# Altium integrated library caravan_pcb.IntLib: 36 symbols
Pins are listed as number, name and electrical type; pins without a type are passive.

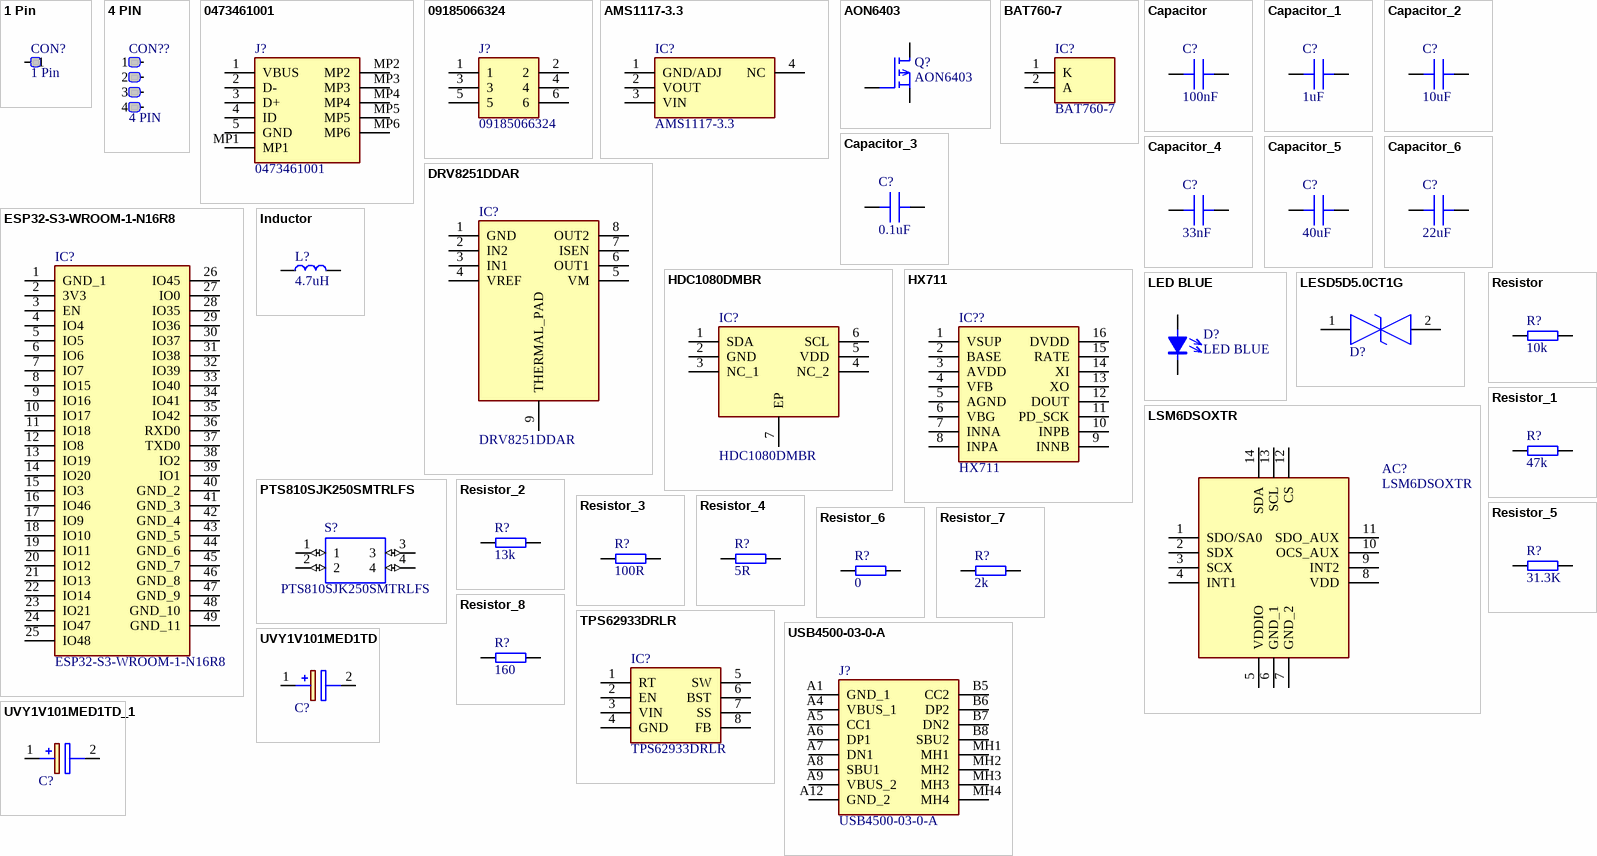
[diagram p0: symbols 1 Pin to UVY1V101MED1TD_1]

## 1 Pin
designator CON?
footprint SMD PAD
footprint SMD PAD 2.54x5.08
footprint GOLDPIN 2.54mm 1P
footprint PAD 1mm
pins: 1

## 4 PIN
designator CON??
footprint SM04B-SRSS-TB
footprint Goldpin 1.27mm 4PIN
footprint BM04B-SRSS-TB
footprint Goldpin 2.54 4P
footprint 4 Pads raster 2.54mm
footprint S/BM04B-SRSS-TB (JST SH 1.00mm 4Pin Side/Top)
pins: 1, 2, 3, 4

## 0473461001
designator J?
Connector; Manufacturer_Name: Molex; Datasheet Link: https://componentsearchengine.com/Datasheets/1/0473461001.pdf; Height: 2.45mm; Manufacturer_Part_Number: 0473461001; Mouser Part Number: N/A; Mouser Price/Stock: https://www.mouser.co.uk/ProductDetail/Molex/0473461001?qs=2bnkQPT%252BPafTZgGVt%2FOGfA%3D%3D; Arrow Part Number: 0473461001; Arrow Price/Stock: https://www.arrow.com/en/products/0473461001/molex?region=nac
footprint 0473461001
pins: 1 VBUS, 2 D-, 3 D+, 4 ID, 5 GND, MP1, MP2, MP3, MP4, MP5, MP6

## 09185066324
designator J?
Connector; Manufacturer_Name: HARTING; Datasheet Link: https://b2b.harting.com/files/download/PRD/PDF_DS/PDF_DS_09185066324_EN.pdf; Manufacturer_Part_Number: 09185066324; Mouser Part Number: 617-09185066324; Mouser Price/Stock: https://www.mouser.co.uk/ProductDetail/HARTING/09185066324?qs=qa49y27LPCE%2F3ZplMsKEeQ%3D%3D; Arrow Part Number: 09185066324; Arrow Price/Stock: https://www.arrow.com/en/products/09185066324/harting?utm_currency=USD&region=europe
footprint 09185066324
pins: 1, 2, 3, 4, 5, 6

## AMS1117-3.3
designator IC?
Integrated Circuit; Manufacturer_Name: Advanced; Datasheet Link: https://datasheet.datasheetarchive.com/originals/distributors/Datasheets-28/DSA-550594.pdf; Height: 1.8mm; Manufacturer_Part_Number: AMS1117-3.3
footprint SOT229P700X180-4N
pins: 1 GND/ADJ, 2 VOUT, 3 VIN, 4 NC

## AON6403
designator Q?
P-Mosfet 30V 67A Rds(on) 3.1mR
footprint DFN 5x6 (PowerMOSFET)
pins: 1, 2, 3 S, 4 G, 5_8 D

## BAT760-7
designator IC?
Integrated Circuit; Manufacturer_Name: Lattice Semiconductor; Datasheet Link: https://www.diodes.com/assets/Datasheets/ds30498.pdf; Height: 1.2mm; Manufacturer_Part_Number: BAT760-7; Mouser Part Number: N/A; Mouser Price/Stock: https://www.mouser.com/Search/Refine.aspx?Keyword=N%2FA
footprint SOD2513X120N
pins: 1 K, 2 A

## Capacitor
designator C?, comment 100nF
MLCC Capacitor
footprint C 0402 (0402 resistor Chip)
footprint C 0603
footprint C 0805
footprint C 1206
pins: 1, 2

## Capacitor_1
designator C?, comment 1uF
MLCC Capacitor
footprint C 0402 (0402 resistor Chip)
footprint C 0603
footprint C 0805
footprint C 1206
pins: 1, 2

## Capacitor_2
designator C?, comment 10uF
MLCC Capacitor
footprint C 0402 (0402 resistor Chip)
footprint C 0603
footprint C 0805
footprint C 1206
pins: 1, 2

## Capacitor_3
designator C?, comment 0.1uF
MLCC Capacitor
footprint C 0402 (0402 resistor Chip)
footprint C 0603
footprint C 0805
footprint C 1206
pins: 1, 2

## Capacitor_4
designator C?, comment 33nF
MLCC Capacitor
footprint C 0402 (0402 resistor Chip)
footprint C 0603
footprint C 0805
footprint C 1206
pins: 1, 2

## Capacitor_5
designator C?, comment 40uF
MLCC Capacitor
footprint C 0402 (0402 resistor Chip)
footprint C 0603
footprint C 0805
footprint C 1206
pins: 1, 2

## Capacitor_6
designator C?, comment 22uF
MLCC Capacitor
footprint C 0402 (0402 resistor Chip)
footprint C 0603
footprint C 0805
footprint C 1206
pins: 1, 2

## DRV8251DDAR
designator IC?
Integrated Circuit; Manufacturer_Name: Texas Instruments; Datasheet Link: https://www.arrow.com/en/products/drv8251ddar/texas-instruments?region=nac; Height: 1.7mm; Manufacturer_Part_Number: DRV8251DDAR; Mouser Part Number: 595-DRV8251DDAR; Mouser Price/Stock: https://www.mouser.co.uk/ProductDetail/Texas-Instruments/DRV8251DDAR?qs=doiCPypUmgHTzZyfapGahQ%3D%3D; Arrow Part Number: DRV8251DDAR; Arrow Price/Stock: https://www.arrow.com/en/products/drv8251ddar/texas-instruments?region=nac
footprint SOIC127P600X170-9N
pins: 1 GND, 2 IN2, 3 IN1, 4 VREF, 5 VM, 6 OUT1, 7 ISEN, 8 OUT2, 9 THERMAL_PAD

## ESP32-S3-WROOM-1-N16R8
designator IC?
Integrated Circuit; Manufacturer_Name: Espressif Systems; Datasheet Link: https://www.espressif.com/sites/default/files/documentation/esp32-s3-wroom-1_wroom-1u_datasheet_en.pdf; Height: 3.25mm; Manufacturer_Part_Number: ESP32-S3-WROOM-1-N16R8; Mouser Part Number: 356-ESP32S3WRM1N16R8; Mouser Price/Stock: https://www.mouser.co.uk/ProductDetail/Espressif-Systems/ESP32-S3-WROOM-1-N16R8?qs=Li%252BoUPsLEnvQc9gW6AMhZg%3D%3D
footprint ESP32S3WROOM1N16R8
pins: 1 GND_1, 2 3V3, 3 EN, 4 IO4, 5 IO5, 6 IO6, 7 IO7, 8 IO15, 9 IO16, 10 IO17, 11 IO18, 12 IO8, 13 IO19, 14 IO20, 15 IO3, 16 IO46, 17 IO9, 18 IO10, 19 IO11, 20 IO12, 21 IO13, 22 IO14, 23 IO21, 24 IO47, 25 IO48, 26 IO45, 27 IO0, 28 IO35, 29 IO36, 30 IO37, 31 IO38, 32 IO39, 33 IO40, 34 IO41, 35 IO42, 36 RXD0, 37 TXD0, 38 IO2, 39 IO1, 40 GND_2, 41 GND_3, 42 GND_4, 43 GND_5, 44 GND_6, 45 GND_7, 46 GND_8, 47 GND_9, 48 GND_10, 49 GND_11

## HDC1080DMBR
designator IC?
Integrated Circuit; Manufacturer_Name: Texas Instruments; Datasheet Link: http://www.ti.com/lit/gpn/HDC1080; Height: 0.8mm; Manufacturer_Part_Number: HDC1080DMBR; Mouser Part Number: 595-HDC1080DMBR; Mouser Price/Stock: https://www.mouser.co.uk/ProductDetail/Texas-Instruments/HDC1080DMBR?qs=8%2FmU9qzJpL9OuhPLRSO9Vg%3D%3D; Arrow Part Number: HDC1080DMBR; Arrow Price/Stock: https://www.arrow.com/en/products/hdc1080dmbr/texas-instruments?region=nac
footprint SON100P300X300X80-7N-D
pins: 1 SDA, 2 GND, 3 NC_1, 4 NC_2, 5 VDD, 6 SCL, 7 EP

## HX711
designator IC??
Integrated Circuit; Manufacturer_Name: AVIA; Datasheet Link: https://cdn.sparkfun.com/datasheets/Sensors/ForceFlex/hx711_english.pdf; Height: 1.6mm; Manufacturer_Part_Number: HX711
footprint SOIC127P600X160-16N
pins: 1 VSUP, 2 BASE, 3 AVDD, 4 VFB, 5 AGND, 6 VBG, 7 INNA, 8 INPA, 9 INNB, 10 INPB, 11 PD_SCK, 12 DOUT, 13 XO, 14 XI, 15 RATE, 16 DVDD

## Inductor
designator L?, comment 4.7uH
General pourpouse inductor
footprint L 0603
footprint L 0805
footprint L 1206
footprint DJNR60454R5FERROCORE
footprint HPI0630 (Power Inductor)
pins: 1, 2

## LED BLUE
designator D?
footprint LED 0603 BLUE
pins: 1, 2

## LESD5D5.0CT1G
designator D?  (value not drawn)
TVS Diode (Bi-directional); Manufacturer_Name: LRC; Height: 0.7mm; Manufacturer_Part_Number: LESD5D5.0CT1G
footprint LESD5D50CT1G
pins: 1, 2

## LSM6DSOXTR
designator AC?
Accelerometer; Manufacturer_Name: STMicroelectronics; Datasheet Link: https://www.st.com/resource/en/datasheet/lsm6dsox.pdf; Manufacturer_Part_Number: LSM6DSOXTR; Mouser Part Number: 511-LSM6DSOXTR; Mouser Price/Stock: https://www.mouser.co.uk/ProductDetail/STMicroelectronics/LSM6DSOXTR?qs=l7cgNqFNU1i9dcjzItLpVQ%3D%3D; Arrow Part Number: LSM6DSOXTR; Arrow Price/Stock: https://www.arrow.com/en/products/lsm6dsoxtr/stmicroelectronics?region=europe
footprint LGA-14_1
pins: 1 SDO/SA0, 2 SDX, 3 SCX, 4 INT1, 5 VDDIO, 6 GND_1, 7 GND_2, 8 VDD, 9 INT2, 10 OCS_AUX, 11 SDO_AUX, 12 CS, 13 SCL, 14 SDA

## PTS810SJK250SMTRLFS
designator S?
Tactile Switch SPST-NO Top Actuated Surface Mount; MF: C&K; SnapEDA_Link: https://www.snapeda.com/parts/PTS810SJK250SMTRLFS/C%26K/view-part/274682/?ref=snap; Package: None; Price: None; MP: PTS810SJK250SMTRLFS; Availability: Unavailable; Value: *
footprint PTS810SJG250SMTRLFS
pins: 1 (io), 2 (io), 3 (io), 4 (io)

## Resistor
designator R?, comment 10k
General pourpouse resistor
footprint R 0402 (0402 resistor Chip)
footprint R 0603
footprint R 0805
footprint R 1206
footprint R 2512
pins: 1, 2

## Resistor_1
designator R?, comment 47k
General pourpouse resistor
footprint R 0402 (0402 resistor Chip)
footprint R 0603
footprint R 0805
footprint R 1206
footprint R 2512
pins: 1, 2

## Resistor_2
designator R?, comment 13k
General pourpouse resistor
footprint R 0402 (0402 resistor Chip)
footprint R 0603
footprint R 0805
footprint R 1206
footprint R 2512
pins: 1, 2

## Resistor_3
designator R?, comment 100R
General pourpouse resistor
footprint R 0402 (0402 resistor Chip)
footprint R 0603
footprint R 0805
footprint R 1206
footprint R 2512
pins: 1, 2

## Resistor_4
designator R?, comment 5R
General pourpouse resistor
footprint R 0402 (0402 resistor Chip)
footprint R 0603
footprint R 0805
footprint R 1206
footprint R 2512
pins: 1, 2

## Resistor_5
designator R?, comment 31.3K
General pourpouse resistor
footprint R 0402 (0402 resistor Chip)
footprint R 0603
footprint R 0805
footprint R 1206
footprint R 2512
pins: 1, 2

## Resistor_6
designator R?, comment 0
General pourpouse resistor
footprint R 0402 (0402 resistor Chip)
footprint R 0603
footprint R 0805
footprint R 1206
footprint R 2512
pins: 1, 2

## Resistor_7
designator R?, comment 2k
General pourpouse resistor
footprint R 0402 (0402 resistor Chip)
footprint R 0603
footprint R 0805
footprint R 1206
footprint R 2512
pins: 1, 2

## Resistor_8
designator R?, comment 160
General pourpouse resistor
footprint R 0402 (0402 resistor Chip)
footprint R 0603
footprint R 0805
footprint R 1206
footprint R 2512
pins: 1, 2

## TPS62933DRLR
designator IC?
Integrated Circuit; Manufacturer_Name: Texas Instruments; Datasheet Link: https://www.ti.com/lit/ds/symlink/tps62933.pdf?ts=1626073394234; Height: 0.6mm; Manufacturer_Part_Number: TPS62933DRLR; Mouser Part Number: 595-TPS62933DRLR; Mouser Price/Stock: https://www.mouser.co.uk/ProductDetail/Texas-Instruments/TPS62933DRLR?qs=Rp5uXu7WBW9fv47wfQVntQ%3D%3D; Arrow Part Number: TPS62933DRLR; Arrow Price/Stock: https://www.arrow.com/en/products/tps62933drlr/texas-instruments?utm_currency=USD&region=nac
footprint SOTFL50P160X60-8N
pins: 1 RT, 2 EN, 3 VIN, 4 GND, 5 SW, 6 BST, 7 SS, 8 FB

## USB4500-03-0-A
designator J?
Connector; Manufacturer_Name: GCT (GLOBAL CONNECTOR TECHNOLOGY); Datasheet Link: https://componentsearchengine.com/Datasheets/2/USB4500-03-0-A.pdf; Manufacturer_Part_Number: USB4500-03-0-A; Mouser Part Number: 640-USB4500030A; Mouser Price/Stock: https://www.mouser.co.uk/ProductDetail/GCT/USB4500-03-0-A?qs=7D1LtPJG0i2mVyw7UtV%2FkQ%3D%3D
footprint USB4500030A
pins: A1 GND_1, A4 VBUS_1, A5 CC1, A6 DP1, A7 DN1, A8 SBU1, A9 VBUS_2, A12 GND_2, B5 CC2, B6 DP2, B7 DN2, B8 SBU2, MH1, MH2, MH3, MH4

## UVY1V101MED1TD
designator C?  (value not drawn)
Capacitor Polarised; Manufacturer_Name: Nichicon; Datasheet Link: http://nichicon-us.com/english/products/pdfs/e-uvy.pdf; Height: 12.5mm; Manufacturer_Part_Number: UVY1V101MED1TD; Arrow Part Number: UVY1V101MED1TD; Arrow Price/Stock: https://www.arrow.com/en/products/uvy1v101med1td/nichicon
footprint CAPPRD250W50D655H1250
pins: 1 +, 2 -

## UVY1V101MED1TD_1
designator C?, comment UVY1V101MED1TD  (value not drawn)
Capacitor Polarised; Manufacturer_Name: Nichicon; Datasheet Link: http://nichicon-us.com/english/products/pdfs/e-uvy.pdf; Height: 12.5mm; Manufacturer_Part_Number: UVY1V101MED1TD; Arrow Part Number: UVY1V101MED1TD; Arrow Price/Stock: https://www.arrow.com/en/products/uvy1v101med1td/nichicon
footprint CAPPRD250W50D655H1250
pins: 1 +, 2 -